# Altium footprint library TransformersTHD.PcbLib: 35 footprints (part 1 of 3)
Each footprint in its own frame and in the unit in brackets; x right, y up, seen from the top. Pads: shape width x height; smd on the part's side, far side on the other; paste and mask are expansions set on the pad; w line width, h text height; cw(c..) or ccw(c..) is an arc to the next point about the centre after c.
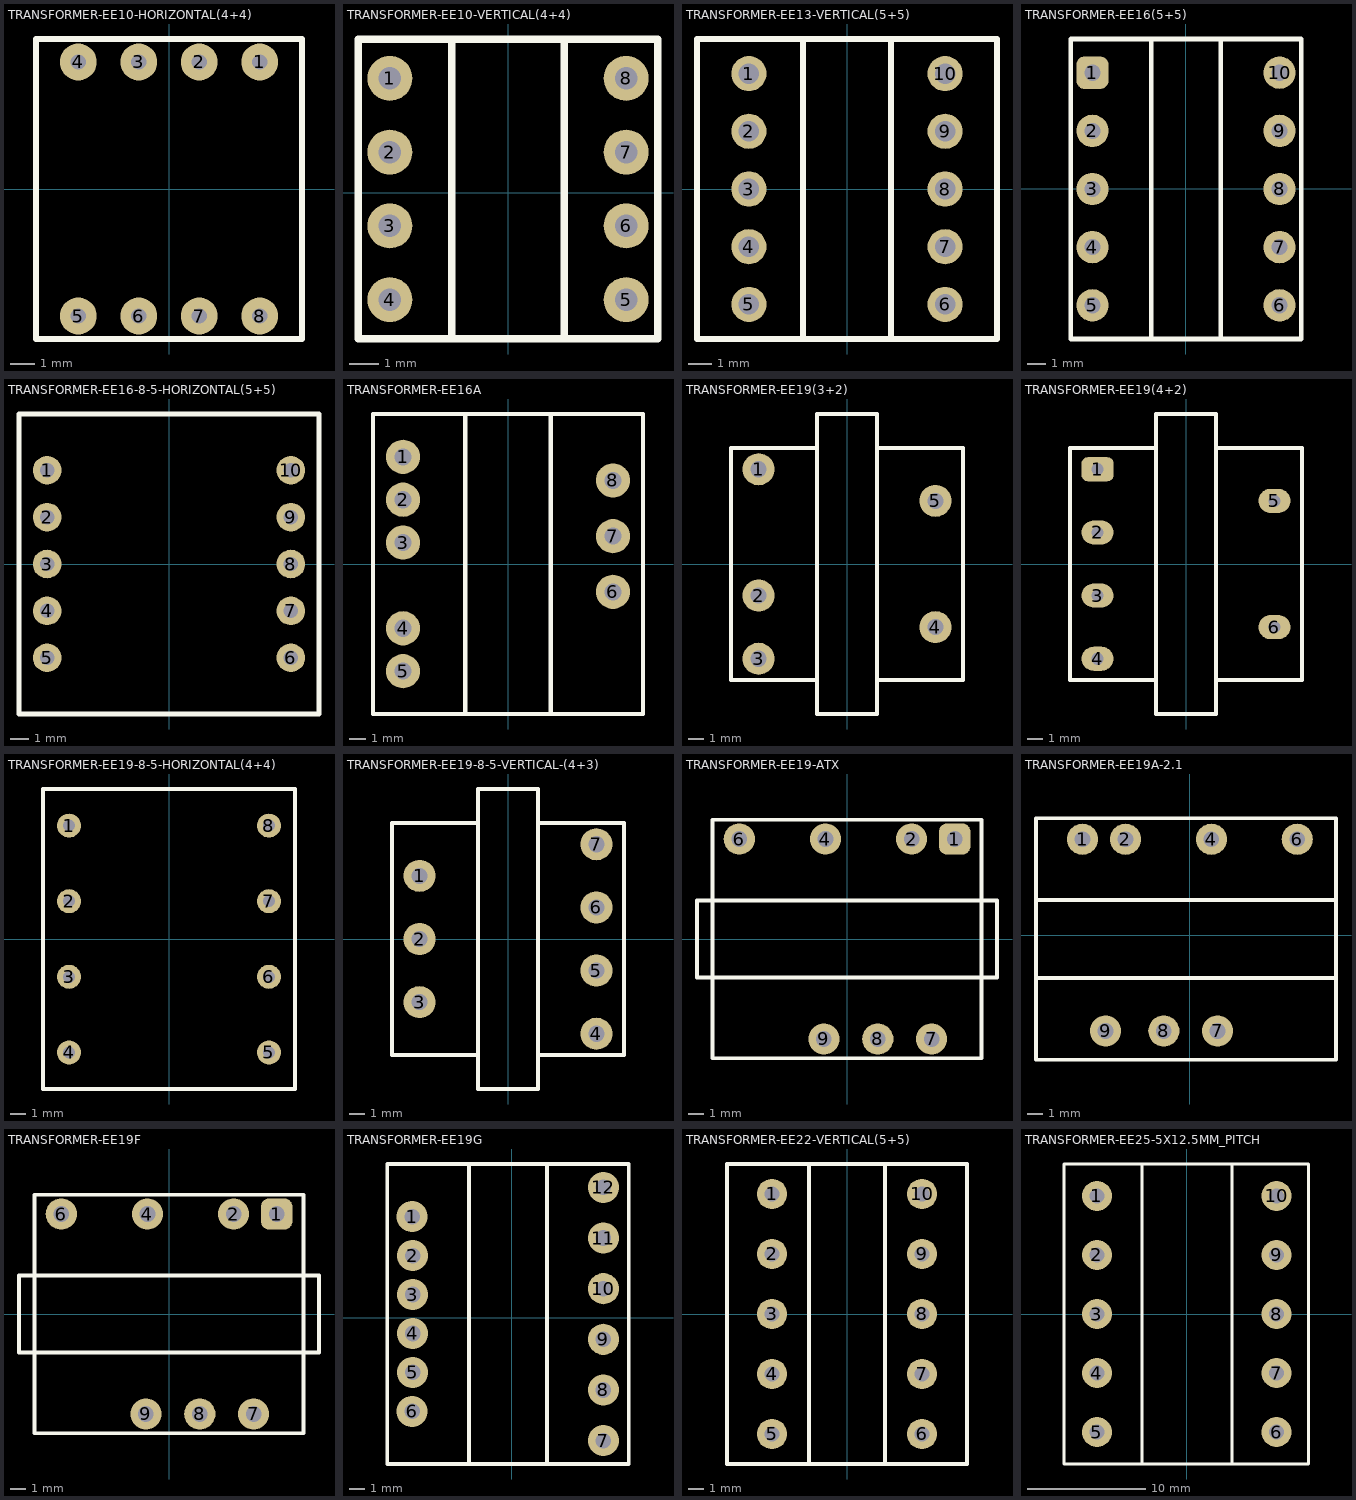
[diagram p0: the footprints below, top view; thin cyan lines are the x and y axes]

## TRANSFORMER-EE10-HORIZONTAL(4+4) [mil]
pads (8):
  round 60 hole 25: 1(147.64,206.69) 2(49.21,206.69) 3(-49.21,206.69) 4(-147.64,206.69) 5(-147.64,-206.69) 6(-49.21,-206.69) 7(49.21,-206.69) 8(147.64,-206.69)
Top Overlay:
  lines w10: -216.54,-244.09 216.54,-244.09 216.54,244.09 -216.54,244.09 -216.54,-244.09
3D body "User Library-EE1-H.STEP": height 421.26, standoff -149.61, extent -212.69,-247 213.3,245.13

## TRANSFORMER-EE10-VERTICAL(4+4) [mil]
pads (8):
  round 60 hole 30: 1(-157.48,152.64) 2(-157.48,54.21) 3(-157.48,-44.21) 4(-157.48,-142.64) 5(157.48,-142.64) 6(157.48,-44.21) 7(157.48,54.21) 8(157.48,152.64)
Top Overlay:
  lines w10: -75,-195 -75,200 ; 75,-195 75,205 ; -200,-195 200,-195 200,205 -200,205 -200,-195
3D body "User Library-TRAFO-EE10(4+4)Pin-Vertical.STEP": height 78.43, standoff -453.07, extent -196.86,-191.85 196.84,201.86

## TRANSFORMER-EE13-VERTICAL(5+5) [mil]
pads (10):
  round 60 hole 35: 1(-167.32,196.85) 2(-167.32,98.43) 3(-167.32,0) 4(-167.32,-98.43) 5(-167.32,-196.85) 6(167.32,-196.85) 7(167.32,-98.43) 8(167.32,0) 9(167.32,98.43) 10(167.32,196.85)
Top Overlay:
  lines w10: -75,-250 -75,250 ; 75,-250 75,250 ; -255.91,-255.91 255.91,-255.91 255.91,255.91 -255.91,255.91 -255.91,-255.91
3D body "EE13.STEP": height 545.8, standoff -115, extent -274.04,-268.26 269.96,268.35

## TRANSFORMER-EE16(5+5) [mil]
pads (10):
  rrect50% 70x70 hole 35: 1(-202.76,251.97)
  round 70 hole 35: 2(-202.76,125.98) 3(-202.76,0) 4(-202.76,-125.98) 5(-202.76,-251.97) 6(202.76,-251.97) 7(202.76,-125.98) 8(202.76,0) 9(202.76,125.98) 10(202.76,251.97)
Top Overlay:
  lines w9.84: -250,-325 -250,325 250,325 250,-325 -250,-325
  lines w10: -75,-325 -75,325 ; 75,-325 75,325
3D body "User Library-EE16(5+5).STEP": height 587.83, standoff -142.48, extent -254.92,-318.89 253.94,318.9

## TRANSFORMER-EE16-8-5-HORIZONTAL(5+5) [mil]
pads (10):
  round 60 hole 30: 1(-255.91,196.85) 2(-255.91,98.43) 3(-255.91,0) 4(-255.91,-98.43) 5(-255.91,-196.85) 6(255.91,-196.85) 7(255.91,-98.43) 8(255.91,0) 9(255.91,98.43) 10(255.91,196.85)
Top Overlay:
  lines w10: -314.96,-314.96 -314.96,314.96 314.96,314.96 314.96,-314.96 -314.96,-314.96
3D body "EE16_8_5_5+5_HG_tx.step": height 463.15, standoff -129.37, extent -354.33,-314.96 354.33,314.96

## TRANSFORMER-EE16A [mil]
pads (8):
  round 80 hole 40: 1(-245,250) 2(-245,150) 3(-245,50) 4(-245,-150) 5(-245,-250) 6(245,-65) 7(245,65) 8(245,195)
Top Overlay:
  lines w10: -100,-350 -100,350 ; 100,-350 100,350 ; -315,-350 315,-350 315,350 -315,350 -315,-350
3D body "User Library-EE-16A.STEP": height 706.69, standoff -122.05, extent -313,-348.43 312.99,348.43

## TRANSFORMER-EE19(3+2) [mil]
pads (5):
  round 80 hole 40: 1(-220.47,236.22) 2(-220.47,-78.74) 3(-220.47,-236.22) 4(220.47,-157.48) 5(220.47,157.48)
Top Overlay:
  lines w10: -75,-289.37 -289.37,-289.37 -289.37,289.37 -75,289.37 ; 75,-289.37 289.37,-289.37 289.37,289.37 75,289.37 ; -75,-374.02 -75,374.02 75,374.02 75,-374.02 -75,-374.02
3D body "EE19-8-5-vertical-4+3-pins.STEP": height 664.96, standoff -153.94, extent -289.38,-374.02 289.36,374.01

## TRANSFORMER-EE19(4+2) [mil]
pads (6):
  rrect50% 80x60 hole 30: 1(-220.47,236.22)
  oval 80x60 hole 30: 2(-220.47,78.74) 3(-220.47,-78.74) 4(-220.47,-236.22) 5(220.47,157.48) 6(220.47,-157.48)
Top Overlay:
  lines w10: -75,-289.37 -289.37,-289.37 -289.37,289.37 -75,289.37 ; 75,-289.37 289.37,-289.37 289.37,289.37 75,289.37 ; -75,-374.02 75,-374.02 75,374.02 -75,374.02 -75,-374.02
3D body "EE19-8-5-vertical-4+3-pins.STEP": height 664.96, standoff -153.94, extent -289.38,-374.02 289.36,374.01

## TRANSFORMER-EE19-8-5-HORIZONTAL(4+4) [mil]
pads (8):
  round 60 hole 30: 1(-250,283.46) 2(-250,94.49) 3(-250,-94.49) 4(-250,-283.46) 5(250,-283.46) 6(250,-94.49) 7(250,94.49) 8(250,283.46)
Top Overlay:
  lines w10: -315,-375 315,-375 315,375 -314.9,375 -315,375.1 -315,-375
3D body "EE19-8-5-horizontal-4-pins-side.STEP": height 510.63, standoff -107.48, extent -314.96,-374.02 314.96,374.02

## TRANSFORMER-EE19-8-5-VERTICAL-(4+3) [mil]
pads (7):
  round 80 hole 40: 1(-220.47,157.48) 2(-220.47,0) 3(-220.47,-157.48) 4(220.47,-236.22) 5(220.47,-78.74) 6(220.47,78.74) 7(220.47,236.22)
Top Overlay:
  lines w10: -75,-289.37 -289.37,-289.37 -289.37,289.37 -75,289.37 ; 75,-289.37 289.37,-289.37 289.37,289.37 75,289.37 ; -75,-374.02 -75,374.02 75,374.02 75,-374.02 -75,-374.02
3D body "EE19-8-5-vertical-4+3-pins.STEP": height 664.96, standoff -153.94, extent -289.36,-374.01 289.38,374.02

## TRANSFORMER-EE19-ATX [mil]
pads (7):
  rrect50% 80x80 hole 40: 1(275.59,255.91)
  round 80 hole 40: 2(165.35,255.91) 4(-55.12,255.91) 6(-275.59,255.91) 7(216.54,-255.91) 8(78.74,-255.91) 9(-59.06,-255.91)
Top Overlay:
  lines w10: -383.86,-98.43 -383.86,98.43 383.86,98.43 383.86,-98.43 -383.86,-98.43 ; -344.49,-305.12 -344.49,305.12 344.49,305.12 344.49,-305.12 -344.49,-305.12

## TRANSFORMER-EE19A-2.1 [mil]
pads (7):
  round 80 hole 40: 1(-275.59,246.06) 2(-165.35,246.06) 4(55.12,246.06) 6(275.59,246.06) 7(70.87,-246.06) 8(-66.93,-246.06) 9(-216.54,-246.06)
Top Overlay:
  lines w10: -395,-110 375,-110 ; -395,90 375,90 ; -395,-320 -395,300 375,300 375,-320 -395,-320
3D body "User Library-EE-19C.STEP": height 755.91, standoff -183.07, extent -395.83,-319.84 375.82,299.85

## TRANSFORMER-EE19F [mil]
pads (7):
  rrect50% 80x80 hole 40: 1(275.59,255.91)
  round 80 hole 40: 2(165.35,255.91) 4(-55.12,255.91) 6(-275.59,255.91) 7(216.54,-255.91) 8(78.74,-255.91) 9(-59.06,-255.91)
Top Overlay:
  lines w10: -383.86,-98.43 -383.86,98.43 383.86,98.43 383.86,-98.43 -383.86,-98.43 ; -344.49,-305.12 -344.49,305.12 344.49,305.12 344.49,-305.12 -344.49,-305.12

## TRANSFORMER-EE19G [mil]
pads (12):
  round 80 hole 40: 1(-256.06,260) 2(-255,160) 3(-255,60) 4(-255,-40) 5(-255,-140) 6(-256.06,-240) 7(235,-315) 8(235,-185) 9(235,-55) 10(235,75) 11(235,205) 12(235,335)
Top Overlay:
  lines w10: -110,-375 -110,395 ; 90,-375 90,395 ; -320,-375 -320,395 300,395 300,-375 -320,-375
3D body "User Library-EE-19C.STEP": height 755.91, standoff -183.07, extent -319.84,-375.82 299.85,395.83

## TRANSFORMER-EE22-VERTICAL(5+5) [mil]
pads (10):
  round 80 hole 40: 1(-196.85,314.96) 2(-196.85,157.48) 3(-196.85,0) 4(-196.85,-157.48) 5(-196.85,-314.96) 6(196.85,-314.96) 7(196.85,-157.48) 8(196.85,0) 9(196.85,157.48) 10(196.85,314.96)
Top Overlay:
  lines w10: -100,-390 -100,390 ; 100,-390 100,390 ; -314.96,-393.7 -314.96,393.7 314.96,393.7 314.96,-393.7 -314.96,-393.7
3D body "User Library-TR_EE22.STEP": height 787.4, standoff -150, extent -316.13,-394.09 314.96,394.09

## TRANSFORMER-EE25-5X12.5MM_PITCH [mm]
pads (10):
  round 2.54 hole 1.27: 1(-7.6,10) 2(-7.6,5) 3(-7.6,0) 4(-7.6,-5) 5(-7.6,-10) 6(7.6,-10) 7(7.6,-5) 8(7.6,0) 9(7.6,5) 10(7.6,10)
Top Overlay:
  lines w0.254: -3.81,-12.7 -3.81,12.7 ; 3.81,-12.7 3.81,12.7 ; -10.414,-12.7 10.287,-12.7 10.287,12.7 -10.414,12.7 -10.414,-12.7
3D body "User Library-Trafo EE25 low profile.STEP": height 21.45, standoff -3.5, extent -9,-12.7 9,12.7